# Altium footprint library My Footprint 3D.PCBLIB: 447 footprints (part 17 of 29)
Each footprint in its own frame and in the unit in brackets; x right, y up, seen from the top. Pads: shape width x height; smd on the part's side, far side on the other; paste and mask are expansions set on the pad; w line width, h text height; cw(c..) or ccw(c..) is an arc to the next point about the centre after c.
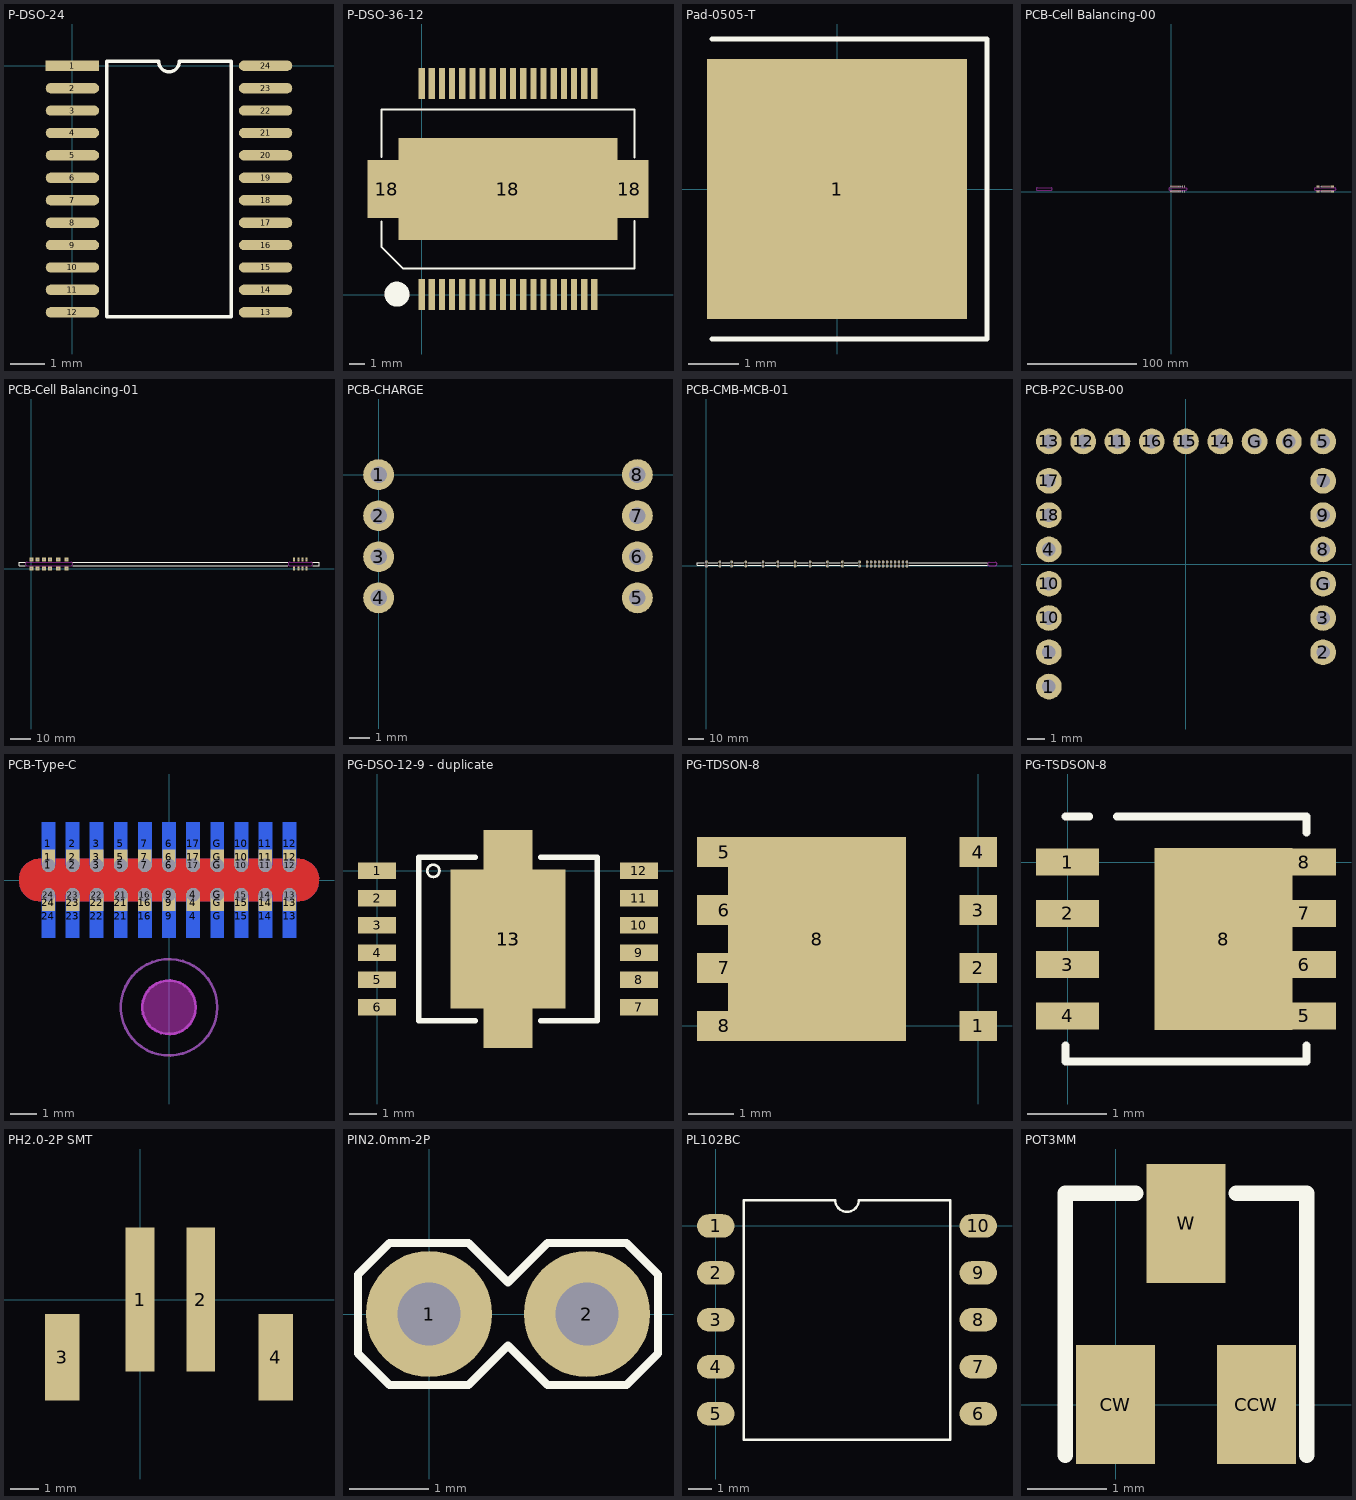
[diagram p16: the footprints below, top view; thin cyan lines are the x and y axes]

## P-DSO-24 [mm]
pads (24):
  rect 1.55x0.3 smd: 1(0,0)
  oval 1.55x0.3 smd: 2(0,-0.65) 3(0,-1.3) 4(0,-1.95) 5(0,-2.6) 6(0,-3.25) 7(0,-3.9) 8(0,-4.55) 9(0,-5.2) 10(0,-5.85) 11(0,-6.5) 12(0,-7.15) 13(5.6,-7.15) 14(5.6,-6.5) 15(5.6,-5.85) 16(5.6,-5.2) 17(5.6,-4.55) 18(5.6,-3.9) 19(5.6,-3.25) 20(5.6,-2.6) 21(5.6,-1.95) 22(5.6,-1.3) 23(5.6,-0.65) 24(5.6,0)
Top Overlay:
  lines w0.1: 1,-7.275 1,0.125 2.5,0.125 ccw(c2.8,0.125) 2.8,-0.175 ccw(c2.8,0.125) 3.1,0.125 4.6,0.125 4.6,-7.275 1,-7.275
3D body: height 1.2, standoff 0.25, extent 0.6,-7.475 5,0.325
3D body: height 1.21, standoff 1, extent 1.003,-0.699 1.6,-0.1
3D body: height 0.7, standoff 0.6, extent 0.3,-0.151 0.6,0.151
3D body: height 0.7, standoff 0, extent 0.2,-0.152 0.3,0.15
3D body: height 0.1, standoff 0, extent -0.4,-0.152 0.2,0.15
3D body: height 0.1, standoff 0, extent -0.4,-0.802 0.2,-0.5
3D body: height 0.7, standoff 0, extent 0.2,-0.802 0.3,-0.5
3D body: height 0.7, standoff 0.6, extent 0.3,-0.801 0.6,-0.499
3D body: height 0.1, standoff 0, extent -0.4,-1.452 0.2,-1.15
3D body: height 0.7, standoff 0, extent 0.2,-1.452 0.3,-1.15
3D body: height 0.7, standoff 0.6, extent 0.3,-1.451 0.6,-1.149
3D body: height 0.1, standoff 0, extent -0.4,-2.102 0.2,-1.8
3D body: height 0.7, standoff 0, extent 0.2,-2.102 0.3,-1.8
3D body: height 0.7, standoff 0.6, extent 0.3,-2.101 0.6,-1.799
3D body: height 0.1, standoff 0, extent -0.4,-2.752 0.2,-2.45
3D body: height 0.7, standoff 0, extent 0.2,-2.752 0.3,-2.45
3D body: height 0.7, standoff 0.6, extent 0.3,-2.751 0.6,-2.449
3D body: height 0.1, standoff 0, extent -0.4,-3.402 0.2,-3.1
3D body: height 0.7, standoff 0, extent 0.2,-3.402 0.3,-3.1
3D body: height 0.7, standoff 0.6, extent 0.3,-3.401 0.6,-3.099
3D body: height 0.1, standoff 0, extent -0.4,-4.052 0.2,-3.75
3D body: height 0.7, standoff 0, extent 0.2,-4.052 0.3,-3.75
3D body: height 0.7, standoff 0.6, extent 0.3,-4.051 0.6,-3.749
3D body: height 0.1, standoff 0, extent -0.4,-4.702 0.2,-4.4
3D body: height 0.7, standoff 0, extent 0.2,-4.702 0.3,-4.4
3D body: height 0.7, standoff 0.6, extent 0.3,-4.701 0.6,-4.399
3D body: height 0.1, standoff 0, extent -0.4,-5.352 0.2,-5.05
3D body: height 0.7, standoff 0, extent 0.2,-5.352 0.3,-5.05
3D body: height 0.7, standoff 0.6, extent 0.3,-5.351 0.6,-5.049
3D body: height 0.1, standoff 0, extent -0.4,-6.002 0.2,-5.7
3D body: height 0.7, standoff 0, extent 0.2,-6.002 0.3,-5.7
3D body: height 0.7, standoff 0.6, extent 0.3,-6.001 0.6,-5.699
3D body: height 0.1, standoff 0, extent -0.4,-6.652 0.2,-6.35
3D body: height 0.7, standoff 0, extent 0.2,-6.652 0.3,-6.35
3D body: height 0.7, standoff 0.6, extent 0.3,-6.651 0.6,-6.349
3D body: height 0.1, standoff 0, extent -0.4,-7.302 0.2,-7
3D body: height 0.7, standoff 0, extent 0.2,-7.302 0.3,-7
3D body: height 0.7, standoff 0.6, extent 0.3,-7.301 0.6,-6.999
3D body: height 0.7, standoff 0.6, extent 5,-0.151 5.3,0.151
3D body: height 0.7, standoff 0, extent 5.3,-0.15 5.4,0.152
3D body: height 0.1, standoff 0, extent 5.4,-0.15 6,0.152
3D body: height 0.7, standoff 0.6, extent 5,-0.801 5.3,-0.499
3D body: height 0.7, standoff 0, extent 5.3,-0.8 5.4,-0.498
3D body: height 0.1, standoff 0, extent 5.4,-0.8 6,-0.498
3D body: height 0.7, standoff 0.6, extent 5,-1.451 5.3,-1.149
3D body: height 0.7, standoff 0, extent 5.3,-1.45 5.4,-1.148
3D body: height 0.1, standoff 0, extent 5.4,-1.45 6,-1.148
3D body: height 0.7, standoff 0.6, extent 5,-2.101 5.3,-1.799
3D body: height 0.7, standoff 0, extent 5.3,-2.1 5.4,-1.798
3D body: height 0.1, standoff 0, extent 5.4,-2.1 6,-1.798
3D body: height 0.7, standoff 0.6, extent 5,-2.751 5.3,-2.449
3D body: height 0.7, standoff 0, extent 5.3,-2.75 5.4,-2.448
3D body: height 0.1, standoff 0, extent 5.4,-2.75 6,-2.448
3D body: height 0.7, standoff 0.6, extent 5,-3.401 5.3,-3.099
3D body: height 0.7, standoff 0, extent 5.3,-3.4 5.4,-3.098
3D body: height 0.1, standoff 0, extent 5.4,-3.4 6,-3.098
3D body: height 0.7, standoff 0.6, extent 5,-4.051 5.3,-3.749
3D body: height 0.7, standoff 0, extent 5.3,-4.05 5.4,-3.748
3D body: height 0.1, standoff 0, extent 5.4,-4.05 6,-3.748
3D body: height 0.7, standoff 0.6, extent 5,-4.701 5.3,-4.399
3D body: height 0.7, standoff 0, extent 5.3,-4.7 5.4,-4.398
3D body: height 0.1, standoff 0, extent 5.4,-4.7 6,-4.398
3D body: height 0.7, standoff 0.6, extent 5,-5.351 5.3,-5.049
3D body: height 0.7, standoff 0, extent 5.3,-5.35 5.4,-5.048
3D body: height 0.1, standoff 0, extent 5.4,-5.35 6,-5.048
3D body: height 0.7, standoff 0.6, extent 5,-6.001 5.3,-5.699
3D body: height 0.7, standoff 0, extent 5.3,-6 5.4,-5.698
3D body: height 0.1, standoff 0, extent 5.4,-6 6,-5.698
3D body: height 0.7, standoff 0.6, extent 5,-6.651 5.3,-6.349
3D body: height 0.7, standoff 0, extent 5.3,-6.65 5.4,-6.348
3D body: height 0.1, standoff 0, extent 5.4,-6.65 6,-6.348
3D body: height 0.1, standoff 0, extent 5.4,-7.3 6,-6.998
3D body: height 0.7, standoff 0, extent 5.3,-7.3 5.4,-6.998
3D body: height 0.7, standoff 0.6, extent 5,-7.301 5.3,-6.999

## P-DSO-36-12 [mm]
height 5
pads (39):
  rect 0.4x2 smd: 1(0,0) 2(0.65,0) 3(1.3,0) 4(1.95,0) 5(2.6,0) 6(3.25,0) 7(3.9,0) 8(4.55,0) 9(5.2,0) 10(5.85,0) 11(6.5,0) 12(7.15,0) 13(7.8,0) 14(8.45,0) 15(9.1,0) 16(9.75,0) 17(10.4,0) 18(11.05,0) 19(11.05,13.5) 20(10.4,13.5) 21(9.75,13.5) 22(9.1,13.5) 23(8.45,13.5) 24(7.8,13.5) 25(7.15,13.5) 26(6.5,13.5) 27(5.85,13.5) 28(5.2,13.5) 29(4.55,13.5) 30(3.9,13.5) 31(3.25,13.5) 32(2.6,13.5) 33(1.95,13.5) 34(1.3,13.5) 35(0.65,13.5) 36(0,13.5)
  rect 2.5x3.7 smd: 18(-2.222,6.75) 18(13.272,6.75)
  rect 14x6.5 smd: 18(5.525,6.75)
Top Overlay:
  circle w1: c-1.579,0.019 r0.3
  lines w0.127: -2.575,4.664 -2.575,3.048 -1.197,1.67 13.625,1.67 13.625,4.699 ; -2.575,8.798 -2.575,11.83 13.625,11.83 13.625,8.763

## Pad-0505-T [mm]
pads (1):
  rect 5.2x5.2 smd: 1(0,0)
Top Overlay:
  lines w0.1: -2.5,-3 3,-3 3,3 -2.5,3
3D body: height 0.3, standoff 0, extent -2.508,-2.508 2.508,2.5

## PCB-Cell Balancing-00 [mm]
pads (30):
  rect 0.8x2 hole 0.5: 1(0,0) 1(0,4.623) 2(1.778,0) 2(1.778,4.623) 3(3.556,0) 3(3.556,4.623) 4(5.334,0) 4(5.334,4.623) 5(7.112,0) 5(7.112,4.623) 6(8.89,0) 6(8.89,4.623) 7(10.668,0) 7(10.668,4.623) 8(12.446,0) 8(12.446,4.623) 10(138.176,-0.025) 10(138.176,4.623) 11(139.954,-0.025) 11(139.954,4.623) 12(141.732,-0.025) 12(141.732,4.623) 13(143.51,-0.025) 13(143.51,4.623) 14(145.288,-0.025) 14(145.288,4.623)
  rect 3x2 hole 0.5: 9(135.255,0) 9(135.255,4.623) 15(148.209,0) 15(148.209,4.623)
Keep-Out Layer:
  lines w0.1: 3.647,3.302 13.746,3.302 ; -1.254,3.302 ccw(c-1.254,2.302) -2.254,2.302 ccw(c-1.254,2.302) -1.254,1.302 13.746,1.302 ccw(c13.746,2.302) 14.746,2.302 ccw(c13.746,2.302) 13.746,3.302 ; -1.254,3.302 13.746,3.302 ; -1.254,3.302 13.746,3.302 ; -124.254,2.302 cw(c-123.254,2.302) -123.254,3.302 -110.254,3.302 cw(c-110.254,2.302) -109.254,2.302 cw(c-110.254,2.302) -110.254,1.302 -123.254,1.302 cw(c-123.254,2.302) -124.254,2.302 ; 131.746,2.302 cw(c132.746,2.302) 132.746,3.302 150.746,3.302 cw(c150.746,2.302) 151.746,2.302 cw(c150.746,2.302) 150.746,1.302 132.746,1.302 cw(c132.746,2.302) 131.746,2.302
3D body "Cell Balancing-01.step": height 45.05, standoff -5.05, extent -128.504,-11.491 155.1,4.9

## PCB-Cell Balancing-01 [mm]
pads (20):
  rect 2x2 hole 0.8: 1(0,0) 1(0,4.4) 2(3,0) 2(3,4.4) 3(6,0) 3(6,4.4) 4(9,0) 4(9,4.4) 5(13,0) 5(13,4.4) 6(17,0) 6(17,4.4)
  rect 1x2 hole 0.5: 7(127,0) 7(127,4.4) 8(129,0) 8(129,4.4) 9(131,0) 9(131,4.4) 10(133,0) 10(133,4.4)
Top Overlay:
  lines w0.1: -3,1.3 -6,1.3 -6,3.1 -3,3.1 ; 20,1.3 124,1.3 ; 20,3.1 124,3.1 ; 136,1.3 139,1.3 139,3.1 136,3.1
Keep-Out Layer:
  lines w0.1: -2,1.3 cw(c-2,2.2) -2,3.1 19,3.1 cw(c19,2.2) 19,1.3 -2,1.3 ; 125,1.3 cw(c125,2.2) 125,3.1 135,3.1 cw(c135,2.2) 135,1.3 125,1.3
3D body "Cell Balancing-01.step": height 46, standoff -4, extent -6,-0.5 139,15.891

## PCB-CHARGE [mm]
pads (8):
  round 1.5 hole 0.8: 1(0,0) 2(0,-2) 3(0,-4) 4(0,-6) 5(12.6,-6) 6(12.6,-4) 7(12.6,-2) 8(12.6,0)
Bottom Overlay:
  lines w0.1: -1,-8.45 1.285,-10.1 13.6,-10.1 13.6,1.4 -1,1.4 -1,-8.45
3D body "CHARGING-PCB-00.step": height 2.9, standoff -11.79, extent -1.025,-11.275 13.575,1.425

## PCB-CMB-MCB-01 [mm]
pads (44):
  oval 1.6x2 hole 1.2: 1(0,0) 2(0,2.54) 3(8.5,0) 4(8.5,2.54) 5(16,0) 6(16,2.54) 7(25,0) 8(25,2.54) 9(36,0) 10(36,2.54) 11(45.5,0) 12(45.5,2.54) 13(56.5,0) 14(56.5,2.54) 15(66,0) 16(66,2.54) 17(77,0) 18(77,2.54) 19(86.5,0) 20(86.5,2.54) 21(97.5,0) 22(97.5,2.54) 23(102.25,0) 24(102.3,2.54) 25(104.84,0) 26(104.84,2.54) 27(107.38,0) 28(107.38,2.54) 29(109.92,0) 30(109.92,2.54) 31(112.46,0) 32(112.46,2.54) 33(115,0) 34(115,2.54) 35(117.54,0) 36(117.54,2.54) 37(120.08,0) 38(120.08,2.54) 39(122.62,0) 40(122.62,2.54) 41(125.16,0) 42(125.16,2.54) 43(127.7,0) 44(127.7,2.54)
Top Overlay:
  lines w0.1: -1.275,0.5 -5.925,0.5 cw(c-5.925,0.625) -6.05,0.625 -6.05,1.95 cw(c-5.95,1.95) -5.95,2.05 -5.5,2.05 -1.275,2.05 ; 1.275,0.5 7.225,0.5 ; 1.275,2.05 7.225,2.05 ; 9.775,0.5 14.725,0.5 ; 9.775,2.05 14.75,2.05 ; 17.275,0.5 23.725,0.5 ; 17.275,2.05 23.725,2.05 ; 26.275,0.49 34.725,0.49 ; 26.275,2.05 34.725,2.05 ; 37.275,0.49 44.225,0.49 ; 37.275,2.05 44.225,2.05 ; 46.775,0.49 55.225,0.49 ; 46.775,2.05 55.225,2.05 ; 57.775,0.49 64.725,0.49 ; 57.775,2.05 64.725,2.05 ; 67.275,0.49 75.725,0.49 ; 67.275,2.05 75.725,2.05 ; 78.275,0.49 85.225,0.49 ; 78.275,2.05 85.225,2.05 ; 87.775,0.49 96.225,0.49 ; 87.775,2.05 96.225,2.05 ; 128.975,0.5 178.9,0.475 ; 128.975,2.05 178.9,2.05
Keep-Out Layer:
  lines w0.1: 178.996,1.289 cw(c179.996,1.289) 179.996,2.29 184.05,2.29 cw(c184.05,1.289) 185.05,1.289 cw(c184.05,1.289) 184.05,0.289 179.996,0.289 cw(c179.996,1.289) 178.996,1.289
3D body: height 46.5, standoff 1.5, extent -6.05,0.5 184.05,2.04
3D body: height 1.5, standoff -2, extent 180,0.5 184.05,2.04
3D body: height 5.5, standoff -2, extent 127.25,2.09 128.15,2.99
3D body: height 5.5, standoff -2, extent 127.25,-0.45 128.15,0.45
3D body: height 1.5, standoff 0, extent 126.43,-1.27 128.97,3.81
3D body: height 5.5, standoff -2, extent 124.71,2.09 125.61,2.99
3D body: height 5.5, standoff -2, extent 124.71,-0.45 125.61,0.45
3D body: height 1.5, standoff 0, extent 123.89,-1.27 126.43,3.81
3D body: height 5.5, standoff -2, extent 122.17,2.09 123.07,2.99
3D body: height 5.5, standoff -2, extent 122.17,-0.45 123.07,0.45
3D body: height 1.5, standoff 0, extent 121.35,-1.27 123.89,3.81
3D body: height 5.5, standoff -2, extent 119.63,2.09 120.53,2.99
3D body: height 5.5, standoff -2, extent 119.63,-0.45 120.53,0.45
3D body: height 1.5, standoff 0, extent 118.81,-1.27 121.35,3.81
3D body: height 5.5, standoff -2, extent 117.09,2.09 117.99,2.99
3D body: height 5.5, standoff -2, extent 117.09,-0.45 117.99,0.45
3D body: height 1.5, standoff 0, extent 116.27,-1.27 118.81,3.81
3D body: height 5.5, standoff -2, extent 114.55,2.09 115.45,2.99
3D body: height 5.5, standoff -2, extent 114.55,-0.45 115.45,0.45
3D body: height 1.5, standoff 0, extent 113.73,-1.27 116.27,3.81
3D body: height 5.5, standoff -2, extent 112.01,2.09 112.91,2.99
3D body: height 5.5, standoff -2, extent 112.01,-0.45 112.91,0.45
3D body: height 1.5, standoff 0, extent 111.19,-1.27 113.73,3.81
3D body: height 5.5, standoff -2, extent 109.47,2.09 110.37,2.99
3D body: height 5.5, standoff -2, extent 109.47,-0.45 110.37,0.45
3D body: height 1.5, standoff 0, extent 108.65,-1.27 111.19,3.81
3D body: height 5.5, standoff -2, extent 106.93,2.09 107.83,2.99
3D body: height 5.5, standoff -2, extent 106.93,-0.45 107.83,0.45
3D body: height 1.5, standoff 0, extent 106.11,-1.27 108.65,3.81
3D body: height 5.5, standoff -2, extent 104.39,2.09 105.29,2.99
3D body: height 5.5, standoff -2, extent 104.39,-0.45 105.29,0.45
3D body: height 1.5, standoff 0, extent 103.57,-1.27 106.11,3.81
3D body: height 5.5, standoff -2, extent 101.85,2.09 102.75,2.99
3D body: height 5.5, standoff -2, extent 101.85,-0.45 102.75,0.45
3D body: height 1.5, standoff 0, extent 101.03,-1.27 103.57,3.81
3D body: height 5.5, standoff -2, extent 97.05,2.09 97.95,2.99
3D body: height 5.5, standoff -2, extent 97.05,-0.45 97.95,0.45
3D body: height 1.5, standoff 0, extent 96.23,-1.27 98.77,3.81
3D body: height 5.5, standoff -2, extent 86.05,2.09 86.95,2.99
3D body: height 5.5, standoff -2, extent 86.05,-0.45 86.95,0.45
3D body: height 1.5, standoff 0, extent 85.23,-1.27 87.77,3.81
3D body: height 5.5, standoff -2, extent 76.55,2.09 77.45,2.99
3D body: height 5.5, standoff -2, extent 76.55,-0.45 77.45,0.45
3D body: height 1.5, standoff 0, extent 75.73,-1.27 78.27,3.81
3D body: height 5.5, standoff -2, extent 65.55,2.09 66.45,2.99
3D body: height 5.5, standoff -2, extent 65.55,-0.45 66.45,0.45
3D body: height 1.5, standoff 0, extent 64.73,-1.27 67.27,3.81
3D body: height 5.5, standoff -2, extent 56.05,2.09 56.95,2.99
3D body: height 5.5, standoff -2, extent 56.05,-0.45 56.95,0.45
3D body: height 1.5, standoff 0, extent 55.23,-1.27 57.77,3.81
3D body: height 5.5, standoff -2, extent 45.05,2.09 45.95,2.99
3D body: height 5.5, standoff -2, extent 45.05,-0.45 45.95,0.45
3D body: height 1.5, standoff 0, extent 44.23,-1.27 46.77,3.81
3D body: height 5.5, standoff -2, extent 35.55,2.09 36.45,2.99
3D body: height 5.5, standoff -2, extent 35.55,-0.45 36.45,0.45
3D body: height 1.5, standoff 0, extent 34.73,-1.27 37.27,3.81
3D body: height 5.5, standoff -2, extent 24.55,2.09 25.45,2.99
3D body: height 5.5, standoff -2, extent 24.55,-0.45 25.45,0.45
3D body: height 1.5, standoff 0, extent 23.73,-1.27 26.27,3.81
3D body: height 5.5, standoff -2, extent 15.55,2.09 16.45,2.99
3D body: height 5.5, standoff -2, extent 15.55,-0.45 16.45,0.45
3D body: height 1.5, standoff 0, extent 14.73,-1.27 17.27,3.81
3D body: height 5.5, standoff -2, extent 8.05,2.09 8.95,2.99
3D body: height 5.5, standoff -2, extent 8.05,-0.45 8.95,0.45
3D body: height 1.5, standoff 0, extent 7.23,-1.27 9.77,3.81
3D body: height 5.5, standoff -2, extent -0.45,2.09 0.45,2.99
3D body: height 5.5, standoff -2, extent -0.45,-0.45 0.45,0.45
3D body: height 1.5, standoff 0, extent -1.27,-1.27 1.27,3.81
3D body "CMB-MCB-01.step": height 46.5, standoff -1.5, extent -5.995,0.015 184.005,15.012

## PCB-P2C-USB-00 [mm]
pads (22):
  round 1.5 hole 0.8: 1(-8,-7.15) 1(-8,-5.15) 2(8,-5.15) 3(8,-3.15) 4(-8,0.85) 5(8,7.15) 6(6,7.15) 7(8,4.85) 8(8,0.85) 9(8,2.85) 10(-8,-3.15) 10(-8,-1.15) 11(-4,7.15) 12(-6,7.15) 13(-8,7.15) 14(2,7.15) 15(0,7.15) 16(-2,7.15) 17(-8,4.85) 18(-8,2.85) G(4,7.15) G(8,-1.15)
3D body "P2C-USB-00.step": height 9.19, standoff -9, extent -9.5,-11.875 9.5,8.675

## PCB-Type-C [mm]
pads (66):
  round 0.5 hole 0.5: 1(-4.5,0.55) 2(-3.6,0.55) 3(-2.7,0.55) 4(0.9,-0.55) 5(-1.8,0.55) 6(0,0.55) 7(-0.9,0.55) 9(0,-0.55) 10(2.7,0.55) 11(3.6,0.55) 12(4.5,0.55) 13(4.5,-0.55) 14(3.6,-0.55) 15(2.7,-0.55) 16(-0.9,-0.55) 17(0.9,0.55) 21(-1.8,-0.55) 22(-2.7,-0.55) 23(-3.6,-0.55) 24(-4.5,-0.55) G(1.8,-0.55) G(1.8,0.55)
  rect 0.5x0.6 smd: 1(-4.5,0.85) 2(-3.6,0.85) 3(-2.7,0.85) 4(0.9,-0.85) 5(-1.8,0.85) 6(0,0.85) 7(-0.9,0.85) 9(0,-0.85) 10(2.7,0.85) 11(3.6,0.85) 12(4.5,0.85) 13(4.5,-0.85) 14(3.6,-0.85) 15(2.7,-0.85) 16(-0.9,-0.85) 17(0.9,0.85) 21(-1.8,-0.85) 22(-2.7,-0.85) 23(-3.6,-0.85) 24(-4.5,-0.85) G(1.8,-0.85) G(1.8,0.85)
  rect 0.5x1.6 smd far side: 1(-4.5,1.35) 2(-3.6,1.35) 3(-2.7,1.35) 4(0.9,-1.35) 5(-1.8,1.35) 6(0,1.35) 7(-0.9,1.35) 9(0,-1.35) 10(2.7,1.35) 11(3.6,1.35) 12(4.5,1.35) 13(4.5,-1.35) 14(3.6,-1.35) 15(2.7,-1.35) 16(-0.9,-1.35) 17(0.9,1.35) 21(-1.8,-1.35) 22(-2.7,-1.35) 23(-3.6,-1.35) 24(-4.5,-1.35) G(1.8,1.35) G(1.8,-1.35)
Top Layer:
  pour cut-out: -4.8,0.8 -4.879,0.8 -5.033,0.769 -5.179,0.709 -5.31,0.621 -5.421,0.51 -5.509,0.379 -5.569,0.233 -5.6,0.079 -5.6,0 -5.6,-0.079 -5.569,-0.233 -5.509,-0.379 -5.421,-0.51 -5.31,-0.621 -5.179,-0.709 -5.033,-0.769 -4.879,-0.8 -4.8,-0.8 4.8,-0.8 4.879,-0.8 5.033,-0.769 5.179,-0.709 5.31,-0.621 5.421,-0.51 5.509,-0.379 5.569,-0.233 5.6,-0.079 5.6,0 5.6,0.079 5.569,0.233 5.509,0.379 5.421,0.51 5.31,0.621 5.179,0.709 5.033,0.769 4.879,0.8 4.8,0.8
Mid-Layer 1:
  pour cut-out: -4.8,0.8 -4.879,0.8 -5.033,0.769 -5.179,0.709 -5.31,0.621 -5.421,0.51 -5.509,0.379 -5.569,0.233 -5.6,0.079 -5.6,0 -5.6,-0.079 -5.569,-0.233 -5.509,-0.379 -5.421,-0.51 -5.31,-0.621 -5.179,-0.709 -5.033,-0.769 -4.879,-0.8 -4.8,-0.8 4.8,-0.8 4.879,-0.8 5.033,-0.769 5.179,-0.709 5.31,-0.621 5.421,-0.51 5.509,-0.379 5.569,-0.233 5.6,-0.079 5.6,0 5.6,0.079 5.569,0.233 5.509,0.379 5.421,0.51 5.31,0.621 5.179,0.709 5.033,0.769 4.879,0.8 4.8,0.8
Mid-Layer 2:
  pour cut-out: -4.8,0.8 -4.879,0.8 -5.033,0.769 -5.179,0.709 -5.31,0.621 -5.421,0.51 -5.509,0.379 -5.569,0.233 -5.6,0.079 -5.6,0 -5.6,-0.079 -5.569,-0.233 -5.509,-0.379 -5.421,-0.51 -5.31,-0.621 -5.179,-0.709 -5.033,-0.769 -4.879,-0.8 -4.8,-0.8 4.8,-0.8 4.879,-0.8 5.033,-0.769 5.179,-0.709 5.31,-0.621 5.421,-0.51 5.509,-0.379 5.569,-0.233 5.6,-0.079 5.6,0 5.6,0.079 5.569,0.233 5.509,0.379 5.421,0.51 5.31,0.621 5.179,0.709 5.033,0.769 4.879,0.8 4.8,0.8
Bottom Layer:
  pour cut-out: -4.8,0.8 -4.879,0.8 -5.033,0.769 -5.179,0.709 -5.31,0.621 -5.421,0.51 -5.509,0.379 -5.569,0.233 -5.6,0.079 -5.6,0 -5.6,-0.079 -5.569,-0.233 -5.509,-0.379 -5.421,-0.51 -5.31,-0.621 -5.179,-0.709 -5.033,-0.769 -4.879,-0.8 -4.8,-0.8 4.8,-0.8 4.879,-0.8 5.033,-0.769 5.179,-0.709 5.31,-0.621 5.421,-0.51 5.509,-0.379 5.569,-0.233 5.6,-0.079 5.6,0 5.6,0.079 5.569,0.233 5.509,0.379 5.421,0.51 5.31,0.621 5.179,0.709 5.033,0.769 4.879,0.8 4.8,0.8
Keep-Out Layer:
  circle w0.1: c0,-4.75 r1
  board cut-out: 1,-4.75 1,-4.652 0.962,-4.458 0.886,-4.276 0.777,-4.113 0.637,-3.973 0.474,-3.864 0.292,-3.788 0.098,-3.75 0,-3.75 -0.098,-3.75 -0.292,-3.788 -0.474,-3.864 -0.637,-3.973 -0.777,-4.113 -0.886,-4.276 -0.962,-4.458 -1,-4.652 -1,-4.75 -1,-4.848 -0.962,-5.042 -0.886,-5.224 -0.777,-5.387 -0.637,-5.527 -0.474,-5.636 -0.292,-5.712 -0.098,-5.75 0,-5.75 0.098,-5.75 0.292,-5.712 0.474,-5.636 0.637,-5.527 0.777,-5.387 0.886,-5.224 0.962,-5.042 1,-4.848
Mechanical 1:
  circle w0.1: c0,-4.75 r1.8
Mechanical 2:
  circle w0.1: c0,-4.75 r1
  lines w0.05: -5.35,0 ccw(c-4.8,0) -4.8,-0.55 4.8,-0.55 ccw(c4.8,0) 5.35,0 ccw(c4.8,0) 4.8,0.55 -4.8,0.55 ccw(c-4.8,0) -5.35,0
3D body "Type-C.step": height 15.2, standoff -2.6, extent -8,-9.8 8,0.5

## PG-DSO-12-9 - duplicate [mm]
pads (14):
  rect 1.4x0.6 smd: 1(0,0) 2(0,-1) 3(0,-2) 4(0,-3) 5(0,-4) 6(0,-5) 7(9.6,-5) 8(9.6,-4) 9(9.6,-3) 10(9.6,-2) 11(9.6,-1) 12(9.6,0)
  rect 1.8x8 smd: 13(4.8,-2.5)
  rect 4.2x5.1 smd: 13(4.8,-2.5)
Top Overlay:
  circle w0.1: c2.062,0 r0.224
  lines w0.2: 3.609,-5.5 1.535,-5.5 1.535,0.5 3.609,0.5 ; 5.991,-5.5 8.065,-5.5 8.065,0.5 5.991,0.5

## PG-TDSON-8 [mm]
pads (9):
  rect 0.82x0.65 smd: 1(0,0) 2(0,1.27) 3(0,2.54) 4(0,3.81)
  rect 1.2x0.65 smd: 5(-5.564,3.81) 6(-5.564,2.54) 7(-5.564,1.27) 8(-5.564,0)
  rect 3.9x4.46 smd: 8(-3.53,1.905)
3D body: height 0.25, standoff 0, extent -5.949,1.045 -5.399,1.495
3D body: height 0.25, standoff 0, extent -5.949,2.315 -5.399,2.765
3D body: height 0.25, standoff 0, extent -5.949,-0.224 -5.399,0.226
3D body: height 0.25, standoff 0, extent -5.949,3.585 -5.399,4.035
3D body: height 0.25, standoff 0, extent -0.361,3.585 0.189,4.035
3D body: height 0.25, standoff 0, extent -0.361,-0.224 0.189,0.226
3D body: height 0.25, standoff 0, extent -0.361,2.315 0.189,2.765
3D body: height 0.25, standoff 0, extent -5.399,-0.795 -1.63,4.605
3D body: height 0.25, standoff 0, extent -0.361,1.045 0.189,1.495
3D body: height 1.1, standoff 0.01, extent -5.83,-0.67 0.07,4.48
3D body: height 1.11, standoff 1.1, extent -1.229,-0.295 -0.63,0.305

## PG-TSDSON-8 [mm]
pads (9):
  rect 0.8x0.34 smd: 1(0,0) 2(0,-0.65) 3(0,-1.3) 4(0,-1.95) 5(3,-1.95) 6(3,-1.3) 7(3,-0.65) 8(3,0)
  rect 1.75x2.3 smd: 8(1.975,-0.975)
Top Overlay:
  lines w0.1: -0.025,-2.525 -0.025,-2.325 ; -0.025,0.575 0.275,0.575 ; 0,-2.525 3,-2.525 ; 0.625,0.575 3,0.575 3.025,0.575 3.025,0.375 ; 3.025,-2.525 3.025,-2.325
3D body: height 0.2, standoff 0, extent 2.975,-0.15 3.175,0.15
3D body: height 0.2, standoff 0, extent 2.975,-0.8 3.175,-0.5
3D body: height 0.2, standoff 0, extent 2.975,-1.45 3.175,-1.15
3D body: height 0.2, standoff 0, extent 2.975,-2.1 3.175,-1.8
3D body: height 0.2, standoff 0, extent -0.175,-2.1 0.025,-1.8
3D body: height 0.2, standoff 0, extent -0.175,-1.45 0.025,-1.15
3D body: height 0.2, standoff 0, extent -0.175,-0.8 0.025,-0.5
3D body: height 0.2, standoff 0, extent -0.175,-0.15 0.025,0.15
3D body: height 1.11, standoff 1.1, extent 0.2,-0.075 0.6,0.325
3D body: height 1.1, standoff 0, extent -0.15,-2.625 3.15,0.675

## PH2.0-2P SMT [mm]
pads (4):
  rect 1x5 smd: 1(0,0) 2(2.1,0)
  rect 1.2x3 smd: 3(-2.7,-2) 4(4.7,-2)
3D body: height 6.1, standoff 0.1, extent -3,-2.4 5,0.4
3D body: height 6.1, standoff 0.1, extent -3,-5 5,-3.1
3D body: height 0.5, standoff 0, extent -0.25,-2.5 0.25,2.4
3D body: height 0.5, standoff 0, extent 1.75,-2.5 2.25,2.4
3D body: height 6, standoff 0, extent 1.75,-2.55 2.25,-2.05
3D body: height 6, standoff 0, extent -0.25,-2.55 0.25,-2.05
3D body: height 0.7, standoff 0.1, extent -3,-5 5,0.4

## PIN2.0mm-2P [mm]
pads (2):
  round 1.6 hole 0.8: 1(0,0) 2(2,0)
Top Overlay:
  lines w0.1: -0.9,-0.5 -0.9,0.5 -0.5,0.9 0.5,0.9 1,0.4 1.5,0.9 2.5,0.9 2.9,0.5 2.9,-0.5 2.5,-0.9 1.5,-0.9 1,-0.4 0.5,-0.9 -0.5,-0.9 -0.9,-0.5
3D body: height 2, standoff 0, extent -1,-1 3,1
3D body: height 6.6, standoff -3, extent 1.75,-0.25 2.25,0.25
3D body: height 6.6, standoff -3, extent -0.25,-0.25 0.25,0.25

## PL102BC [mm]
height 1.5
pads (10):
  oval 1.6x1 smd: 1(0,0) 2(0,-2) 3(0,-4) 4(0,-6) 5(0,-8) 6(11.176,-8) 7(11.176,-6) 8(11.176,-4) 9(11.176,-2) 10(11.176,0)
Top Overlay:
  lines w0.1: 9.988,-9.1 ccw(c9.988,-9.1) 9.988,-9.1 ; 9.988,-9.1 5.088,-9.1 1.188,-9.1 1.188,1.1 5.088,1.1 ccw(c5.588,1.1) 5.588,0.6 ccw(c5.588,1.1) 6.088,1.1 9.988,1.1 9.988,-9.1
3D body: height 0.63, standoff 0, extent 10.643,-0.47 11.151,0.47
3D body: height 0.63, standoff 0, extent 10.643,-2.47 11.151,-1.53
3D body: height 0.63, standoff 0, extent 10.643,-4.47 11.151,-3.53
3D body: height 0.63, standoff 0, extent 10.643,-6.47 11.151,-5.53
3D body: height 0.63, standoff 0, extent 10.643,-8.47 11.151,-7.53
3D body: height 0.63, standoff 0, extent 0.025,-8.47 0.533,-7.53
3D body: height 0.63, standoff 0, extent 0.025,-6.47 0.533,-5.53
3D body: height 0.63, standoff 0, extent 0.025,-4.47 0.533,-3.53
3D body: height 0.63, standoff 0, extent 0.025,-2.47 0.533,-1.53
3D body: height 0.63, standoff 0, extent 0.025,-0.47 0.533,0.47
3D body: height 2, standoff 0.6, extent 6.147,0.039 6.528,1.309
3D body: height 2, standoff 0.6, extent 4.496,0.039 4.877,1.309
3D body: height 2, standoff 0.6, extent 4.877,0.039 6.147,1.309
3D body: height 1.2, standoff 0.6, extent 7.188,0.166 7.696,0.343
3D body: height 1.2, standoff 0.6, extent 7.188,1.004 7.696,1.182
3D body: height 1.2, standoff 0.6, extent 7.188,0.343 7.696,1.004
3D body: height 1.2, standoff 0.6, extent 3.378,0.343 3.886,1.004
3D body: height 1.2, standoff 0.6, extent 3.378,1.004 3.886,1.182
3D body: height 1.2, standoff 0.6, extent 3.378,0.166 3.886,0.343
3D body: height 1.2, standoff 0.6, extent 2.083,0.089 2.743,0.598
3D body: height 1.2, standoff 0.6, extent 2.743,0.089 2.921,0.597
3D body: height 1.2, standoff 0.6, extent 1.905,0.09 2.083,0.598
3D body: height 1.2, standoff 0.6, extent 2.083,0.724 2.743,1.233
3D body: height 1.2, standoff 0.6, extent 2.743,0.724 2.921,1.232
3D body: height 1.2, standoff 0.6, extent 1.905,0.725 2.083,1.233
3D body: height 1.2, standoff 0.6, extent 1.397,-6.616 1.905,-5.956
3D body: height 1.2, standoff 0.6, extent 1.397,-6.794 1.905,-6.616
3D body: height 1.2, standoff 0.6, extent 1.397,-5.956 1.905,-5.778
3D body: height 1.2, standoff 0.6, extent 0.762,-4.66 1.27,-4
3D body: height 1.2, standoff 0.6, extent 0.762,-4.838 1.27,-4.66
3D body: height 1.2, standoff 0.6, extent 0.762,-4 1.27,-3.822
3D body: height 1.2, standoff 0.6, extent 1.397,-4.66 1.905,-4
3D body: height 1.2, standoff 0.6, extent 1.397,-4.838 1.905,-4.66
3D body: height 1.2, standoff 0.6, extent 1.397,-4 1.905,-3.822
3D body: height 1.2, standoff 0.6, extent 1.397,-2.171 1.905,-1.993
3D body: height 1.2, standoff 0.6, extent 1.397,-3.009 1.905,-2.832
3D body: height 1.2, standoff 0.6, extent 1.397,-2.832 1.905,-2.171
3D body: height 1.2, standoff 0.6, extent 0.762,-2.171 1.27,-1.993
3D body: height 1.2, standoff 0.6, extent 0.762,-3.009 1.27,-2.832
3D body: height 1.2, standoff 0.6, extent 0.762,-2.832 1.27,-2.171
3D body: height 1.2, standoff 0.6, extent 0.762,-1.358 0.94,-0.85
3D body: height 1.2, standoff 0.6, extent 1.6,-1.358 1.778,-0.85
3D body: height 1.2, standoff 0.6, extent 0.94,-1.358 1.6,-0.85
3D body: height 1.2, standoff 0.6, extent 0.762,-0.596 0.94,-0.088
3D body: height 1.2, standoff 0.6, extent 1.6,-0.596 1.778,-0.088
3D body: height 1.2, standoff 0.6, extent 0.94,-0.596 1.6,-0.088
3D body: height 1.2, standoff 0.6, extent 8.128,1.004 8.636,1.182
3D body: height 1.2, standoff 0.6, extent 8.128,0.166 8.636,0.343
3D body: height 1.2, standoff 0.6, extent 8.128,0.343 8.636,1.004
3D body: height 1.2, standoff 0.6, extent 10.109,0.242 10.287,0.75
3D body: height 1.2, standoff 0.6, extent 9.271,0.242 9.449,0.75
3D body: height 1.2, standoff 0.6, extent 9.449,0.242 10.109,0.75
3D body: height 1.2, standoff 0.6, extent 10.109,-0.52 10.287,-0.012
3D body: height 1.2, standoff 0.6, extent 9.271,-0.52 9.449,-0.012
3D body: height 1.2, standoff 0.6, extent 9.449,-0.52 10.109,-0.012
3D body: height 1.2, standoff 0.6, extent 10.109,-1.282 10.287,-0.774
3D body: height 1.2, standoff 0.6, extent 9.271,-1.282 9.449,-0.774
3D body: height 1.2, standoff 0.6, extent 9.449,-1.282 10.109,-0.774
3D body: height 1.2, standoff 0.6, extent 10.109,-2.044 10.287,-1.536
3D body: height 1.2, standoff 0.6, extent 9.271,-2.044 9.449,-1.536
3D body: height 1.2, standoff 0.6, extent 9.449,-2.044 10.109,-1.536
3D body: height 1.2, standoff 0.6, extent 10.109,-2.806 10.287,-2.298
3D body: height 1.2, standoff 0.6, extent 9.271,-2.806 9.449,-2.298
3D body: height 1.2, standoff 0.6, extent 9.449,-2.806 10.109,-2.298
3D body: height 1.2, standoff 0.6, extent 10.109,-3.568 10.287,-3.06
3D body: height 1.2, standoff 0.6, extent 9.271,-3.568 9.449,-3.06
3D body: height 1.2, standoff 0.6, extent 9.449,-3.568 10.109,-3.06
3D body: height 1.2, standoff 0.6, extent 10.109,-4.33 10.287,-3.822
3D body: height 1.2, standoff 0.6, extent 9.271,-4.33 9.449,-3.822
3D body: height 1.2, standoff 0.6, extent 9.449,-4.33 10.109,-3.822
3D body: height 0.6, standoff 0, extent 0.088,-9.5 11.088,1.5
3D body: height 1.7, standoff 0.7, extent 2.012,-7.099 9.012,-0.099
3D body: height 1.99, standoff 0, extent 2.188,-9.398 8.188,-7.402
3D body: height 0.8, standoff 0.6, extent 6.888,-8.1 8.888,-7.9
3D body: height 0.8, standoff 0.6, extent 6.888,-8.9 8.888,-8.7
3D body: height 1.2, standoff 0.6, extent 9.449,-6.616 10.109,-6.108
3D body: height 1.2, standoff 0.6, extent 9.271,-6.616 9.449,-6.108
3D body: height 1.2, standoff 0.6, extent 10.109,-6.616 10.287,-6.108
3D body: height 1.2, standoff 0.6, extent 10.109,-5.854 10.287,-5.346
3D body: height 1.2, standoff 0.6, extent 9.271,-5.854 9.449,-5.346
3D body: height 1.2, standoff 0.6, extent 9.449,-5.854 10.109,-5.346
3D body: height 1.2, standoff 0.6, extent 10.109,-5.092 10.287,-4.584
3D body: height 1.2, standoff 0.6, extent 9.271,-5.092 9.449,-4.584
3D body: height 1.2, standoff 0.6, extent 9.449,-5.092 10.109,-4.584

## POT3MM [mm]
height 3
pads (3):
  rect 1x1.5 smd: CCW(1.778,0) CW(0,0) W(0.889,2.286)
Top Overlay:
  lines w0.2: -0.635,-0.635 -0.635,2.667 0.254,2.667 ; 1.524,2.667 2.413,2.667 2.413,-0.635